# Altium footprint library DataTranslator.PcbLib: 12 footprints
Each footprint in its own frame and in the unit in brackets; x right, y up, seen from the top. Pads: shape width x height; smd on the part's side, far side on the other; paste and mask are expansions set on the pad; w line width, h text height; cw(c..) or ccw(c..) is an arc to the next point about the centre after c.
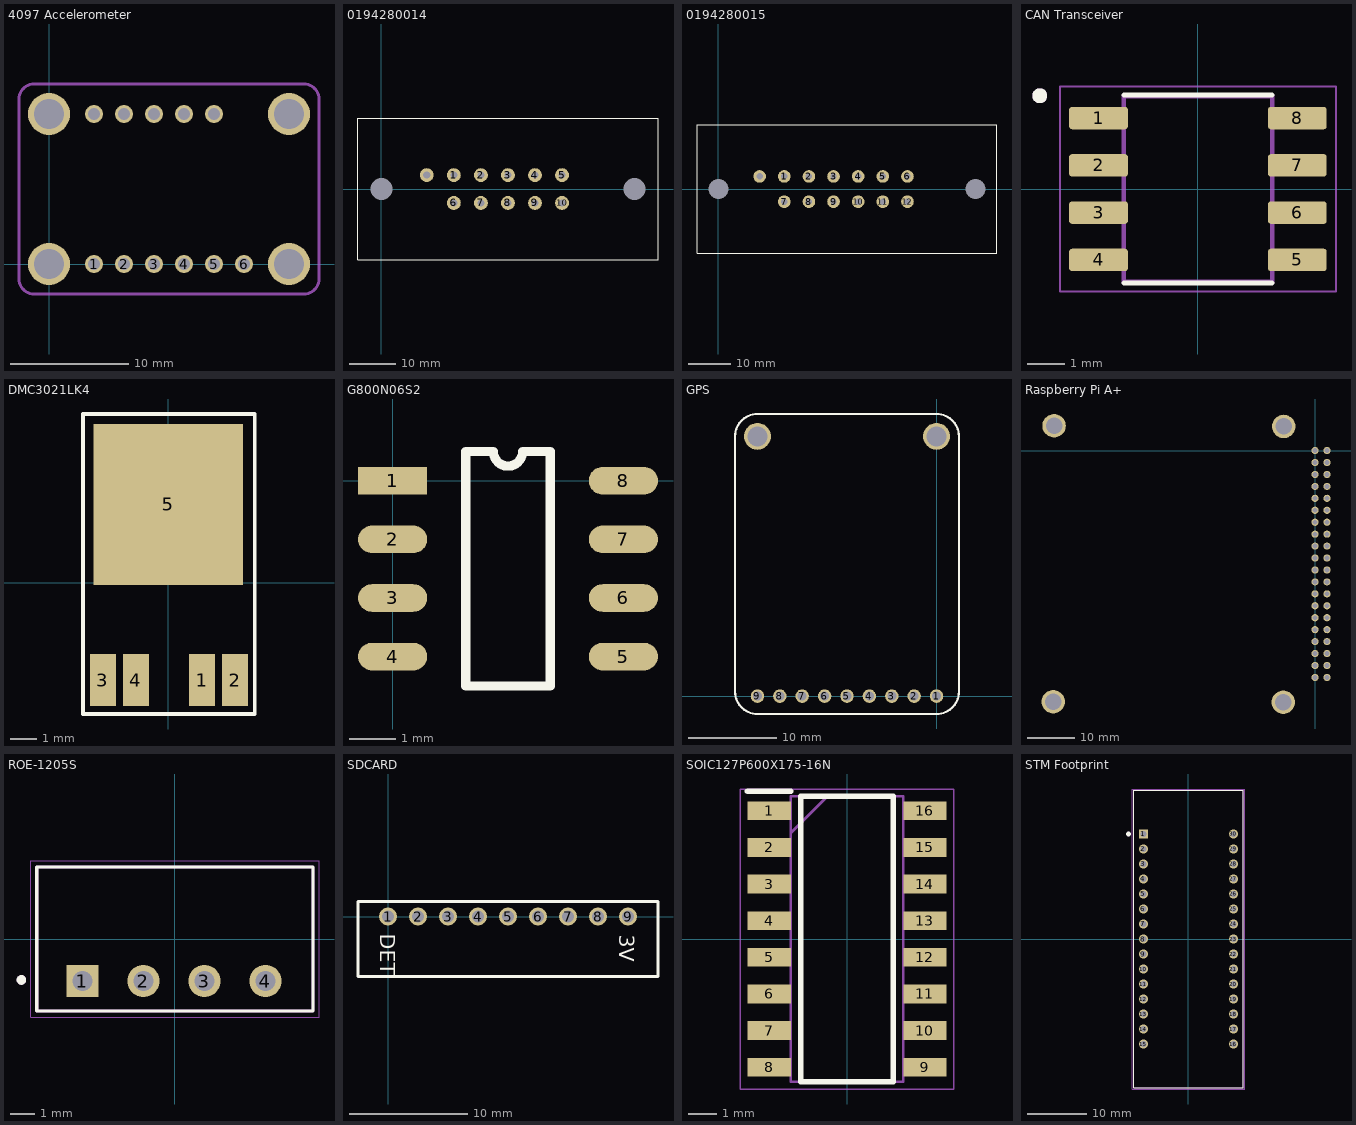
[diagram p0: the footprints below, top view; thin cyan lines are the x and y axes]

## 4097 Accelerometer [mil]
pads (15):
  round 60 hole 40 unplated: 1(150,0) 2(250,0) 3(350,0) 4(450,0) 5(550,0) 6(650,0) ""(150,500) ""(250,500) ""(350,500) ""(450,500) ""(550,500)
  round 140 hole 100 unplated: ""(-0.08,0) ""(0,500) ""(800,0) ""(800,500)
Mechanical 1:
  lines w10: -100,-50 ccw(c-50,-50) -50,-100 850,-100 ccw(c850,-50) 900,-50 900,550 ccw(c850,550) 850,600 -50,600 ccw(c-50,550) -100,550 -100,-50

## 0194280014 [mm]
pads (13):
  round 3 hole 1.52 unplated: 1(15.61,2.99) 2(21.45,2.99) 3(27.29,2.99) 4(33.13,2.99) 5(38.97,2.99) 6(15.61,-3.01) 7(21.45,-3.01) 8(27.29,-3.01) 9(33.13,-3.01) 10(38.97,-3.01) ""(9.77,2.99)
  rect 0x0 hole 4.78 unplated: ""(0,0) ""(54.61,0)
Top Overlay:
  lines w0.254: -5.07,-15.24 59.68,-15.24 59.68,15.24 -5.07,15.24 -5.07,-15.24
3D body "194280014_Tin.stp": height 27.78, standoff -3.31, extent -5.062,-15.24 59.662,15.24

## 0194280015 [mm]
pads (15):
  round 3 hole 1.52 unplated: 1(15.61,2.99) 2(21.45,2.99) 3(27.29,2.99) 4(33.13,2.99) 5(38.97,2.99) 6(44.81,2.99) 7(15.61,-3.01) 8(21.45,-3.01) 9(27.29,-3.01) 10(33.13,-3.01) 11(38.97,-3.01) 12(44.81,-3.01) ""(9.77,2.99)
  rect 0x0 hole 4.78 unplated: ""(0,0) ""(60.96,0)
Top Overlay:
  lines w0.254: -5.08,-15.24 66.04,-15.24 66.04,15.24 -5.08,15.24 -5.08,-15.24
3D body "194280015_Tin.stp": height 27.78, standoff -3.31, extent -5.079,-15.24 65.986,15.24

## CAN Transceiver [mm]
pads (8):
  rrect25% 1.58x0.6 smd: 1(-2.67,1.905) 2(-2.67,0.635) 3(-2.67,-0.635) 4(-2.67,-1.905) 5(2.67,-1.905) 6(2.67,-0.635) 7(2.67,0.635) 8(2.67,1.905)
Top Overlay:
  circle w0.2: c-4.25,2.505 r0.1
  lines w0.127: -1.995,-2.525 1.995,-2.525 ; -1.995,2.525 1.995,2.525
Mechanical 13:
  circle w0.2: c-4.25,2.505 r0.1
  lines w0.127: -1.995,-2.5 1.995,-2.5 1.995,2.5 -1.995,2.5 -1.995,-2.5
Mechanical 15:
  lines w0.05: -3.71,-2.75 3.71,-2.75 3.71,2.75 -3.71,2.75 -3.71,-2.75
3D body "SN.STEP": height 1.76, standoff 0.01, extent -3,-2.45 3,2.45

## DMC3021LK4 [mm]
pads (5):
  rect 1x2 smd: 1(1.3,-3.75) 2(2.57,-3.75) 3(-2.51,-3.75) 4(-1.24,-3.75)
  rect 5.73x6.17 smd: 5(0,3)
Top Overlay:
  lines w0.15: -3.275,-5.05 3.325,-5.05 3.325,6.475 -3.275,6.475 -3.275,-5.05
3D body "to252-4_p1-27_l6-8_w5-8.stp": height 2.4, standoff -0.01, extent -3.35,-4.1 3.45,6.1

## G800N06S2 [mm]
pads (8):
  rect 1.5x0.6 smd: 1(0,0)
  oval 1.5x0.6 smd: 2(0,-1.27) 3(0,-2.54) 4(0,-3.81) 5(5,-3.81) 6(5,-2.54) 7(5,-1.27) 8(5,0)
Top Overlay:
  lines w0.2: 1.585,-4.445 1.585,0.635 2.183,0.635 ccw(c2.5,0.635) 2.818,0.635 3.415,0.635 3.415,-4.445 1.585,-4.445

## GPS [mil]
pads (11):
  round 60 hole 40: 1(0,0) 2(-100,0) 3(-200,0) 4(-300,0) 5(-400,0) 6(-500,0) 7(-600,0) 8(-700,0) 9(-800,0)
  round 120 / inner round 60 / far side round 60 hole 90: ""(-800,1160) ""(0,1160)
Top Overlay:
  lines w10: -900,20 ccw(c-800,20) -800,-80 0,-80 ccw(c0,20) 100,20 100,1160 ccw(c0,1160) 0,1260 -800,1260 ccw(c-800,1160) -900,1160 -900,20

## Raspberry Pi A+ [mm]
pads (44):
  round 1.53 hole 1.02: 1(0,0) 2(2.54,0) 3(0,-2.54) 4(2.54,-2.54) 5(0,-5.08) 6(2.54,-5.08) 7(0,-7.62) 8(2.54,-7.62) 9(0,-10.16) 10(2.54,-10.16) 11(0,-12.7) 12(2.54,-12.7) 13(0,-15.24) 14(2.54,-15.24) 15(0,-17.78) 16(2.54,-17.78) 17(0,-20.32) 18(2.54,-20.32) 19(0,-22.86) 20(2.54,-22.86) 21(0,-25.4) 22(2.54,-25.4) 23(0,-27.94) 24(2.54,-27.94) 25(0,-30.48) 26(2.54,-30.48) 27(0,-33.02) 28(2.54,-33.02) 29(0,-35.56) 30(2.54,-35.56) 31(0,-38.1) 32(2.54,-38.1) 33(0,-40.64) 34(2.54,-40.64) 35(0,-43.18) 36(2.54,-43.18) 37(0,-45.72) 38(2.54,-45.72) 39(0,-48.26) 40(2.54,-48.26)
  round 5 hole 3.5: ""(-55.728,-53.416) ""(-55.524,5.283) ""(-6.756,-53.543) ""(-6.68,5.131)
3D body "7-146256-0--3DModel-STEP-1.STEP": height 8.38, standoff -2.79, extent -1.168,-49.276 3.708,1.118
3D body "A+.stp": height -5.1, standoff -20.2, extent -59.896,-59.088 -3.683,10.676

## ROE-1205S [mm]
pads (4):
  rect 1.338x1.338 hole 0.83: 1(-3.85,-1.75)
  round 1.338 hole 0.83: 2(-1.31,-1.75) 3(1.23,-1.75) 4(3.77,-1.75)
Top Overlay:
  circle w0.2: c-6.39,-1.705 r0.1
  lines w0.127: -5.75,-3 5.75,-3 5.75,3 -5.75,3 -5.75,-3
Top 3D Body:
  circle w0.2: c-6.39,-1.705 r0.1
  lines w0.127: -5.75,-3 5.75,-3 5.75,3 -5.75,3 -5.75,-3
Top Courtyard:
  lines w0.05: -6,-3.25 6,-3.25 6,3.25 -6,3.25 -6,-3.25
3D body "step_temp.STEP": height 9.5, standoff -4.6, extent -5.75,-3 5.75,3

## SDCARD [mil]
pads (9):
  round 60 hole 40 unplated: 1(0,0) 2(100,0) 3(200,0) 4(300,0) 5(400,0) 6(500,0) 7(600,0) 8(700,0) 9(800,0)
Top Overlay:
  lines w10: -100,-200 900,-200 900,50 -100,50 -100,-200
  text "DET" at -26,-57 h50
  text "3V" at 770,-60 h50
3D body "SDREADER.stp": height 1034.68, standoff -253.24, extent -100,-197.64 900,50

## SOIC127P600X175-16N [mm]
pads (16):
  rect 1.5x0.65 smd: 1(-2.7,4.445) 2(-2.7,3.175) 3(-2.7,1.905) 4(-2.7,0.635) 5(-2.7,-0.635) 6(-2.7,-1.905) 7(-2.7,-3.175) 8(-2.7,-4.445) 9(2.7,-4.445) 10(2.7,-3.175) 11(2.7,-1.905) 12(2.7,-0.635) 13(2.7,0.635) 14(2.7,1.905) 15(2.7,3.175) 16(2.7,4.445)
Top Overlay:
  lines w0.2: -3.45,5.12 -1.95,5.12 ; -1.6,-4.95 1.6,-4.95 1.6,4.95 -1.6,4.95 -1.6,-4.95
Mechanical 15:
  lines w0.1: -1.95,3.68 -0.68,4.95 ; -1.95,-4.95 1.95,-4.95 1.95,4.95 -1.95,4.95 -1.95,-4.95
Mechanical 20:
  lines w0.05: -3.7,-5.2 3.7,-5.2 3.7,5.2 -3.7,5.2 -3.7,-5.2
3D body "MCP3008-I_SL.stp": height 5.8, standoff -4.65, extent -10,-3.376 10,3.376

## STM Footprint [mm]
pads (30):
  rect 1.53x1.53 hole 1.02: 1(-7.62,17.78)
  round 1.53 hole 1.02: 2(-7.62,15.24) 3(-7.62,12.7) 4(-7.62,10.16) 5(-7.62,7.62) 6(-7.62,5.08) 7(-7.62,2.54) 8(-7.62,0) 9(-7.62,-2.54) 10(-7.62,-5.08) 11(-7.62,-7.62) 12(-7.62,-10.16) 13(-7.62,-12.7) 14(-7.62,-15.24) 15(-7.62,-17.78) 16(7.62,-17.78) 17(7.62,-15.24) 18(7.62,-12.7) 19(7.62,-10.16) 20(7.62,-7.62) 21(7.62,-5.08) 22(7.62,-2.54) 23(7.62,0) 24(7.62,2.54) 25(7.62,5.08) 26(7.62,7.62) 27(7.62,10.16) 28(7.62,12.7) 29(7.62,15.24) 30(7.62,17.78)
Top Overlay:
  circle w0.4: c-10.16,17.78 r0.2
  lines w0.127: -9.27,-25.145 9.27,-25.145 9.27,25.145 -9.27,25.145 -9.27,-25.145
Mechanical 13:
  circle w0.4: c-10.16,17.78 r0.2
  lines w0.127: -9.27,-25.145 9.27,-25.145 9.27,25.145 -9.27,25.145 -9.27,-25.145
Mechanical 15:
  lines w0.05: -9.52,-25.395 9.52,-25.395 9.52,25.395 -9.52,25.395 -9.52,-25.395
3D body "NUCLEO-F303K8--3DModel-STEP-56544.STEP": height 8.51, standoff -5.99, extent -9.274,-24.295 9.271,27.708